# Altium footprint library Connector_PinHeader_2.00mm.PcbLib: 278 footprints (part 5 of 18) (continued)
## PinHeader_1x19_P2.00mm_Horizontal [mm] (continued)
  text "'.Designator'" at 3.006,-21.642 h0.9

## PinHeader_1x19_P2.00mm_Vertical [mm]
pads (19):
  rect 1.35x1.35 hole 0.8: 1(0,0)
  rrect100% 1.35x1.35 hole 0.8: 2(0,-2) 3(0,-4) 4(0,-6) 5(0,-8) 6(0,-10) 7(0,-12) 8(0,-14) 9(0,-16) 10(0,-18) 11(0,-20) 12(0,-22) 13(0,-24) 14(0,-26) 15(0,-28) 16(0,-30) 17(0,-32) 18(0,-34) 19(0,-36)
F.SilkS:
  lines w0.12: -1.06,0 -1.06,1.06 0,1.06 ; -1.06,-37.06 1.06,-37.06 1.06,-1 -1.06,-1 -1.06,-37.06
F.CrtYd:
  lines w0.05: -1.5,-37.5 1.5,-37.5 1.5,1.5 -1.5,1.5 -1.5,-37.5
F.Fab:
  lines w0.1: -1,-37 1,-37 1,1 -0.5,1 -1,0.5 -1,-37
  text "'.Designator'" at 0.84,-22.047 h1

## PinHeader_1x19_P2.00mm_Vertical_SMD_Pin1Left [mm]
pads (19):
  rect 2.35x0.85 smd: 1(-1.175,18) 2(1.175,16) 3(-1.175,14) 4(1.175,12) 5(-1.175,10) 6(1.175,8) 7(-1.175,6) 8(1.175,4) 9(-1.175,2) 10(1.175,0) 11(-1.175,-2) 12(1.175,-4) 13(-1.175,-6) 14(1.175,-8) 15(-1.175,-10) 16(1.175,-12) 17(-1.175,-14) 18(1.175,-16) 19(-1.175,-18)
F.SilkS:
  lines w0.12: -2.29,18.685 -1.06,18.685 -1.06,19.06 1.06,19.06 1.06,16.685 ; -1.06,-19.06 1.06,-19.06 ; -1.06,-17.315 -1.06,-14.685 ; -1.06,-13.315 -1.06,-10.685 ; -1.06,-9.315 -1.06,-6.685 ; -1.06,-5.315 -1.06,-2.685 ; -1.06,-1.315 -1.06,1.315 ; -1.06,2.685 -1.06,5.315 ; -1.06,6.685 -1.06,9.315 ; -1.06,10.685 -1.06,13.315 ; -1.06,14.685 -1.06,17.315 ; 1.06,-18.685 1.06,-19.06 ; 1.06,-16.685 1.06,-19.06 ; 1.06,-15.315 1.06,-12.685 ; 1.06,-11.315 1.06,-8.685 ; 1.06,-7.315 1.06,-4.685 ; 1.06,-3.315 1.06,-0.685 ; 1.06,0.685 1.06,3.315 ; 1.06,4.685 1.06,7.315 ; 1.06,8.685 1.06,11.315 ; 1.06,12.685 1.06,15.315
F.CrtYd:
  lines w0.05: -2.85,-19.5 2.85,-19.5 2.85,19.5 -2.85,19.5 -2.85,-19.5
F.Fab:
  lines w0.1: -1,-18.25 -2.1,-18.25 -2.1,-17.75 -1,-17.75 ; -1,-14.25 -2.1,-14.25 -2.1,-13.75 -1,-13.75 ; -1,-10.25 -2.1,-10.25 -2.1,-9.75 -1,-9.75 ; -1,-6.25 -2.1,-6.25 -2.1,-5.75 -1,-5.75 ; -1,-2.25 -2.1,-2.25 -2.1,-1.75 -1,-1.75 ; -1,1.75 -2.1,1.75 -2.1,2.25 -1,2.25 ; -1,5.75 -2.1,5.75 -2.1,6.25 -1,6.25 ; -1,9.75 -2.1,9.75 -2.1,10.25 -1,10.25 ; -1,13.75 -2.1,13.75 -2.1,14.25 -1,14.25 ; -1,17.75 -2.1,17.75 -2.1,18.25 -1,18.25 ; 1,-16.25 2.1,-16.25 2.1,-15.75 1,-15.75 ; 1,-12.25 2.1,-12.25 2.1,-11.75 1,-11.75 ; 1,-8.25 2.1,-8.25 2.1,-7.75 1,-7.75 ; 1,-4.25 2.1,-4.25 2.1,-3.75 1,-3.75 ; 1,-0.25 2.1,-0.25 2.1,0.25 1,0.25 ; 1,3.75 2.1,3.75 2.1,4.25 1,4.25 ; 1,7.75 2.1,7.75 2.1,8.25 1,8.25 ; 1,11.75 2.1,11.75 2.1,12.25 1,12.25 ; 1,15.75 2.1,15.75 2.1,16.25 1,16.25 ; -1,18.25 -1,-19 1,-19 1,19 -0.25,19 -1,18.25
  text "'.Designator'" at 0.84,-4.047 h1

## PinHeader_1x19_P2.00mm_Vertical_SMD_Pin1Right [mm]
pads (19):
  rect 2.35x0.85 smd: 1(1.175,18) 2(-1.175,16) 3(1.175,14) 4(-1.175,12) 5(1.175,10) 6(-1.175,8) 7(1.175,6) 8(-1.175,4) 9(1.175,2) 10(-1.175,0) 11(1.175,-2) 12(-1.175,-4) 13(1.175,-6) 14(-1.175,-8) 15(1.175,-10) 16(-1.175,-12) 17(1.175,-14) 18(-1.175,-16) 19(1.175,-18)
F.SilkS:
  lines w0.12: -1.06,-18.685 -1.06,-19.06 ; -1.06,-16.685 -1.06,-19.06 ; -1.06,-15.315 -1.06,-12.685 ; -1.06,-11.315 -1.06,-8.685 ; -1.06,-7.315 -1.06,-4.685 ; -1.06,-3.315 -1.06,-0.685 ; -1.06,0.685 -1.06,3.315 ; -1.06,4.685 -1.06,7.315 ; -1.06,8.685 -1.06,11.315 ; -1.06,12.685 -1.06,15.315 ; -1.06,16.685 -1.06,19.06 1.06,19.06 1.06,18.685 2.29,18.685 ; 1.06,-19.06 -1.06,-19.06 ; 1.06,-17.315 1.06,-14.685 ; 1.06,-13.315 1.06,-10.685 ; 1.06,-9.315 1.06,-6.685 ; 1.06,-5.315 1.06,-2.685 ; 1.06,-1.315 1.06,1.315 ; 1.06,2.685 1.06,5.315 ; 1.06,6.685 1.06,9.315 ; 1.06,10.685 1.06,13.315 ; 1.06,14.685 1.06,17.315
F.CrtYd:
  lines w0.05: -2.85,-19.5 2.85,-19.5 2.85,19.5 -2.85,19.5 -2.85,-19.5
F.Fab:
  lines w0.1: -1,-16.25 -2.1,-16.25 -2.1,-15.75 -1,-15.75 ; -1,-12.25 -2.1,-12.25 -2.1,-11.75 -1,-11.75 ; -1,-8.25 -2.1,-8.25 -2.1,-7.75 -1,-7.75 ; -1,-4.25 -2.1,-4.25 -2.1,-3.75 -1,-3.75 ; -1,-0.25 -2.1,-0.25 -2.1,0.25 -1,0.25 ; -1,3.75 -2.1,3.75 -2.1,4.25 -1,4.25 ; -1,7.75 -2.1,7.75 -2.1,8.25 -1,8.25 ; -1,11.75 -2.1,11.75 -2.1,12.25 -1,12.25 ; -1,15.75 -2.1,15.75 -2.1,16.25 -1,16.25 ; 1,-18.25 2.1,-18.25 2.1,-17.75 1,-17.75 ; 1,-14.25 2.1,-14.25 2.1,-13.75 1,-13.75 ; 1,-10.25 2.1,-10.25 2.1,-9.75 1,-9.75 ; 1,-6.25 2.1,-6.25 2.1,-5.75 1,-5.75 ; 1,-2.25 2.1,-2.25 2.1,-1.75 1,-1.75 ; 1,1.75 2.1,1.75 2.1,2.25 1,2.25 ; 1,5.75 2.1,5.75 2.1,6.25 1,6.25 ; 1,9.75 2.1,9.75 2.1,10.25 1,10.25 ; 1,13.75 2.1,13.75 2.1,14.25 1,14.25 ; 1,17.75 2.1,17.75 2.1,18.25 1,18.25 ; 1,18.25 1,-19 -1,-19 -1,19 0.25,19 1,18.25
  text "'.Designator'" at 0.84,-4.047 h1

## PinHeader_1x20_P2.00mm_Horizontal [mm]
pads (20):
  rect 1.35x1.35 hole 0.8: 1(0,0)
  rrect100% 1.35x1.35 hole 0.8: 2(0,-2) 3(0,-4) 4(0,-6) 5(0,-8) 6(0,-10) 7(0,-12) 8(0,-14) 9(0,-16) 10(0,-18) 11(0,-20) 12(0,-22) 13(0,-24) 14(0,-26) 15(0,-28) 16(0,-30) 17(0,-32) 18(0,-34) 19(0,-36) 20(0,-38)
F.SilkS:
  lines w0.12: -1,0 -1,1 0,1 ; 0.882,-38.31 1.44,-38.31 ; 0.882,-37.69 1.44,-37.69 ; 0.882,-36.31 1.44,-36.31 ; 0.882,-35.69 1.44,-35.69 ; 0.882,-34.31 1.44,-34.31 ; 0.882,-33.69 1.44,-33.69 ; 0.882,-32.31 1.44,-32.31 ; 0.882,-31.69 1.44,-31.69 ; 0.882,-30.31 1.44,-30.31 ; 0.882,-29.69 1.44,-29.69 ; 0.882,-28.31 1.44,-28.31 ; 0.882,-27.69 1.44,-27.69 ; 0.882,-26.31 1.44,-26.31 ; 0.882,-25.69 1.44,-25.69 ; 0.882,-24.31 1.44,-24.31 ; 0.882,-23.69 1.44,-23.69 ; 0.882,-22.31 1.44,-22.31 ; 0.882,-21.69 1.44,-21.69 ; 0.882,-20.31 1.44,-20.31 ; 0.882,-19.69 1.44,-19.69 ; 0.882,-18.31 1.44,-18.31 ; 0.882,-17.69 1.44,-17.69 ; 0.882,-16.31 1.44,-16.31 ; 0.882,-15.69 1.44,-15.69 ; 0.882,-14.31 1.44,-14.31 ; 0.882,-13.69 1.44,-13.69 ; 0.882,-12.31 1.44,-12.31 ; 0.882,-11.69 1.44,-11.69 ; 0.882,-10.31 1.44,-10.31 ; 0.882,-9.69 1.44,-9.69 ; 0.882,-8.31 1.44,-8.31 ; 0.882,-7.69 1.44,-7.69 ; 0.882,-6.31 1.44,-6.31 ; 0.882,-5.69 1.44,-5.69 ; 0.882,-4.31 1.44,-4.31 ; 0.882,-3.69 1.44,-3.69 ; 0.882,-2.31 1.44,-2.31 ; 0.882,-1.69 1.44,-1.69 ; 0.935,-0.31 1.44,-0.31 ; 0.935,0.31 1.44,0.31 ; 1.44,-37 3.06,-37 ; 1.44,-35 3.06,-35 ; 1.44,-33 3.06,-33 ; 1.44,-31 3.06,-31 ; 1.44,-29 3.06,-29 ; 1.44,-27 3.06,-27 ; 1.44,-25 3.06,-25 ; 1.44,-23 3.06,-23 ; 1.44,-21 3.06,-21 ; 1.44,-19 3.06,-19 ; 1.44,-17 3.06,-17 ; 1.44,-15 3.06,-15 ; 1.44,-13 3.06,-13 ; 1.44,-11 3.06,-11 ; 1.44,-9 3.06,-9 ; 1.44,-7 3.06,-7 ; 1.44,-5 3.06,-5 ; 1.44,-3 3.06,-3 ; 1.44,-1 3.06,-1 ; 3.06,-38.31 7.26,-38.31 7.26,-37.69 3.06,-37.69 ; 3.06,-36.31 7.26,-36.31 7.26,-35.69 3.06,-35.69 ; 3.06,-34.31 7.26,-34.31 7.26,-33.69 3.06,-33.69 ; 3.06,-32.31 7.26,-32.31 7.26,-31.69 3.06,-31.69 ; 3.06,-30.31 7.26,-30.31 7.26,-29.69 3.06,-29.69 ; 3.06,-28.31 7.26,-28.31 7.26,-27.69 3.06,-27.69 ; 3.06,-26.31 7.26,-26.31 7.26,-25.69 3.06,-25.69 ; 3.06,-24.31 7.26,-24.31 7.26,-23.69 3.06,-23.69 ; 3.06,-22.31 7.26,-22.31 7.26,-21.69 3.06,-21.69 ; 3.06,-20.31 7.26,-20.31 7.26,-19.69 3.06,-19.69 ; 3.06,-18.31 7.26,-18.31 7.26,-17.69 3.06,-17.69 ; 3.06,-16.31 7.26,-16.31 7.26,-15.69 3.06,-15.69 ; 3.06,-14.31 7.26,-14.31 7.26,-13.69 3.06,-13.69 ; 3.06,-12.31 7.26,-12.31 7.26,-11.69 3.06,-11.69 ; 3.06,-10.31 7.26,-10.31 7.26,-9.69 3.06,-9.69 ; 3.06,-8.31 7.26,-8.31 7.26,-7.69 3.06,-7.69 ; 3.06,-6.31 7.26,-6.31 7.26,-5.69 3.06,-5.69 ; 3.06,-4.31 7.26,-4.31 7.26,-3.69 3.06,-3.69 ; 3.06,-2.31 7.26,-2.31 7.26,-1.69 3.06,-1.69 ; 3.06,-0.31 7.26,-0.31 7.26,0.31 3.06,0.31 ; 3.06,-0.23 7.26,-0.23 ; 3.06,-0.11 7.26,-0.11 ; 3.06,0.01 7.26,0.01 ; 3.06,0.13 7.26,0.13 ; 3.06,0.25 7.26,0.25 ; 1.44,-39.06 3.06,-39.06 3.06,1.06 1.44,1.06 1.44,-39.06
F.CrtYd:
  lines w0.05: -1.5,-39.5 -1.5,1.5 7.7,1.5 7.7,-39.5 -1.5,-39.5
F.Fab:
  lines w0.1: 1.5,-38.25 -0.25,-38.25 -0.25,-37.75 1.5,-37.75 ; 1.5,-36.25 -0.25,-36.25 -0.25,-35.75 1.5,-35.75 ; 1.5,-34.25 -0.25,-34.25 -0.25,-33.75 1.5,-33.75 ; 1.5,-32.25 -0.25,-32.25 -0.25,-31.75 1.5,-31.75 ; 1.5,-30.25 -0.25,-30.25 -0.25,-29.75 1.5,-29.75 ; 1.5,-28.25 -0.25,-28.25 -0.25,-27.75 1.5,-27.75 ; 1.5,-26.25 -0.25,-26.25 -0.25,-25.75 1.5,-25.75 ; 1.5,-24.25 -0.25,-24.25 -0.25,-23.75 1.5,-23.75 ; 1.5,-22.25 -0.25,-22.25 -0.25,-21.75 1.5,-21.75 ; 1.5,-20.25 -0.25,-20.25 -0.25,-19.75 1.5,-19.75 ; 1.5,-18.25 -0.25,-18.25 -0.25,-17.75 1.5,-17.75 ; 1.5,-16.25 -0.25,-16.25 -0.25,-15.75 1.5,-15.75 ; 1.5,-14.25 -0.25,-14.25 -0.25,-13.75 1.5,-13.75 ; 1.5,-12.25 -0.25,-12.25 -0.25,-11.75 1.5,-11.75 ; 1.5,-10.25 -0.25,-10.25 -0.25,-9.75 1.5,-9.75 ; 1.5,-8.25 -0.25,-8.25 -0.25,-7.75 1.5,-7.75 ; 1.5,-6.25 -0.25,-6.25 -0.25,-5.75 1.5,-5.75 ; 1.5,-4.25 -0.25,-4.25 -0.25,-3.75 1.5,-3.75 ; 1.5,-2.25 -0.25,-2.25 -0.25,-1.75 1.5,-1.75 ; 1.5,-0.25 -0.25,-0.25 -0.25,0.25 1.5,0.25 ; 3,-38.25 7.2,-38.25 7.2,-37.75 3,-37.75 ; 3,-36.25 7.2,-36.25 7.2,-35.75 3,-35.75 ; 3,-34.25 7.2,-34.25 7.2,-33.75 3,-33.75 ; 3,-32.25 7.2,-32.25 7.2,-31.75 3,-31.75 ; 3,-30.25 7.2,-30.25 7.2,-29.75 3,-29.75 ; 3,-28.25 7.2,-28.25 7.2,-27.75 3,-27.75 ; 3,-26.25 7.2,-26.25 7.2,-25.75 3,-25.75 ; 3,-24.25 7.2,-24.25 7.2,-23.75 3,-23.75 ; 3,-22.25 7.2,-22.25 7.2,-21.75 3,-21.75 ; 3,-20.25 7.2,-20.25 7.2,-19.75 3,-19.75 ; 3,-18.25 7.2,-18.25 7.2,-17.75 3,-17.75 ; 3,-16.25 7.2,-16.25 7.2,-15.75 3,-15.75 ; 3,-14.25 7.2,-14.25 7.2,-13.75 3,-13.75 ; 3,-12.25 7.2,-12.25 7.2,-11.75 3,-11.75 ; 3,-10.25 7.2,-10.25 7.2,-9.75 3,-9.75 ; 3,-8.25 7.2,-8.25 7.2,-7.75 3,-7.75 ; 3,-6.25 7.2,-6.25 7.2,-5.75 3,-5.75 ; 3,-4.25 7.2,-4.25 7.2,-3.75 3,-3.75 ; 3,-2.25 7.2,-2.25 7.2,-1.75 3,-1.75 ; 3,-0.25 7.2,-0.25 7.2,0.25 3,0.25 ; 1.5,-39 3,-39 3,1 1.875,1 1.5,0.625 1.5,-39
  text "'.Designator'" at 3.006,-22.642 h0.9

## PinHeader_1x20_P2.00mm_Vertical [mm]
pads (20):
  rect 1.35x1.35 hole 0.8: 1(0,0)
  rrect100% 1.35x1.35 hole 0.8: 2(0,-2) 3(0,-4) 4(0,-6) 5(0,-8) 6(0,-10) 7(0,-12) 8(0,-14) 9(0,-16) 10(0,-18) 11(0,-20) 12(0,-22) 13(0,-24) 14(0,-26) 15(0,-28) 16(0,-30) 17(0,-32) 18(0,-34) 19(0,-36) 20(0,-38)
F.SilkS:
  lines w0.12: -1.06,0 -1.06,1.06 0,1.06 ; -1.06,-39.06 1.06,-39.06 1.06,-1 -1.06,-1 -1.06,-39.06
F.CrtYd:
  lines w0.05: -1.5,-39.5 -1.5,1.5 1.5,1.5 1.5,-39.5 -1.5,-39.5
F.Fab:
  lines w0.1: -1,-39 1,-39 1,1 -0.5,1 -1,0.5 -1,-39
  text "'.Designator'" at 0.84,-23.047 h1

## PinHeader_1x20_P2.00mm_Vertical_SMD_Pin1Left [mm]
pads (20):
  rect 2.35x0.85 smd: 1(-1.175,19) 2(1.175,17) 3(-1.175,15) 4(1.175,13) 5(-1.175,11) 6(1.175,9) 7(-1.175,7) 8(1.175,5) 9(-1.175,3) 10(1.175,1) 11(-1.175,-1) 12(1.175,-3) 13(-1.175,-5) 14(1.175,-7) 15(-1.175,-9) 16(1.175,-11) 17(-1.175,-13) 18(1.175,-15) 19(-1.175,-17) 20(1.175,-19)
F.SilkS:
  lines w0.12: -2.29,19.685 -1.06,19.685 -1.06,20.06 1.06,20.06 1.06,17.685 ; -1.06,-17.685 -1.06,-20.06 1.06,-20.06 1.06,-19.685 ; -1.06,-16.315 -1.06,-13.685 ; -1.06,-12.315 -1.06,-9.685 ; -1.06,-8.315 -1.06,-5.685 ; -1.06,-4.315 -1.06,-1.685 ; -1.06,-0.315 -1.06,2.315 ; -1.06,3.685 -1.06,6.315 ; -1.06,7.685 -1.06,10.315 ; -1.06,11.685 -1.06,14.315 ; -1.06,15.685 -1.06,18.315 ; 1.06,-18.315 1.06,-15.685 ; 1.06,-14.315 1.06,-11.685 ; 1.06,-10.315 1.06,-7.685 ; 1.06,-6.315 1.06,-3.685 ; 1.06,-2.315 1.06,0.315 ; 1.06,1.685 1.06,4.315 ; 1.06,5.685 1.06,8.315 ; 1.06,9.685 1.06,12.315 ; 1.06,13.685 1.06,16.315
F.CrtYd:
  lines w0.05: -2.85,-20.5 2.85,-20.5 2.85,20.5 -2.85,20.5 -2.85,-20.5
F.Fab:
  lines w0.1: -1,-17.25 -2.1,-17.25 -2.1,-16.75 -1,-16.75 ; -1,-13.25 -2.1,-13.25 -2.1,-12.75 -1,-12.75 ; -1,-9.25 -2.1,-9.25 -2.1,-8.75 -1,-8.75 ; -1,-5.25 -2.1,-5.25 -2.1,-4.75 -1,-4.75 ; -1,-1.25 -2.1,-1.25 -2.1,-0.75 -1,-0.75 ; -1,2.75 -2.1,2.75 -2.1,3.25 -1,3.25 ; -1,6.75 -2.1,6.75 -2.1,7.25 -1,7.25 ; -1,10.75 -2.1,10.75 -2.1,11.25 -1,11.25 ; -1,14.75 -2.1,14.75 -2.1,15.25 -1,15.25 ; -1,18.75 -2.1,18.75 -2.1,19.25 -1,19.25 ; 1,-19.25 2.1,-19.25 2.1,-18.75 1,-18.75 ; 1,-15.25 2.1,-15.25 2.1,-14.75 1,-14.75 ; 1,-11.25 2.1,-11.25 2.1,-10.75 1,-10.75 ; 1,-7.25 2.1,-7.25 2.1,-6.75 1,-6.75 ; 1,-3.25 2.1,-3.25 2.1,-2.75 1,-2.75 ; 1,0.75 2.1,0.75 2.1,1.25 1,1.25 ; 1,4.75 2.1,4.75 2.1,5.25 1,5.25 ; 1,8.75 2.1,8.75 2.1,9.25 1,9.25 ; 1,12.75 2.1,12.75 2.1,13.25 1,13.25 ; 1,16.75 2.1,16.75 2.1,17.25 1,17.25 ; -1,19.25 -1,-20 1,-20 1,20 -0.25,20 -1,19.25
  text "'.Designator'" at 0.84,-4.047 h1

## PinHeader_1x20_P2.00mm_Vertical_SMD_Pin1Right [mm]
pads (20):
  rect 2.35x0.85 smd: 1(1.175,19) 2(-1.175,17) 3(1.175,15) 4(-1.175,13) 5(1.175,11) 6(-1.175,9) 7(1.175,7) 8(-1.175,5) 9(1.175,3) 10(-1.175,1) 11(1.175,-1) 12(-1.175,-3) 13(1.175,-5) 14(-1.175,-7) 15(1.175,-9) 16(-1.175,-11) 17(1.175,-13) 18(-1.175,-15) 19(1.175,-17) 20(-1.175,-19)
F.SilkS:
  lines w0.12: -1.06,-19.685 -1.06,-20.06 1.06,-20.06 1.06,-17.685 ; -1.06,-18.315 -1.06,-15.685 ; -1.06,-14.315 -1.06,-11.685 ; -1.06,-10.315 -1.06,-7.685 ; -1.06,-6.315 -1.06,-3.685 ; -1.06,-2.315 -1.06,0.315 ; -1.06,1.685 -1.06,4.315 ; -1.06,5.685 -1.06,8.315 ; -1.06,9.685 -1.06,12.315 ; -1.06,13.685 -1.06,16.315 ; -1.06,17.685 -1.06,20.06 1.06,20.06 1.06,19.685 2.29,19.685 ; 1.06,-16.315 1.06,-13.685 ; 1.06,-12.315 1.06,-9.685 ; 1.06,-8.315 1.06,-5.685 ; 1.06,-4.315 1.06,-1.685 ; 1.06,-0.315 1.06,2.315 ; 1.06,3.685 1.06,6.315 ; 1.06,7.685 1.06,10.315 ; 1.06,11.685 1.06,14.315 ; 1.06,15.685 1.06,18.315
F.CrtYd:
  lines w0.05: -2.85,-20.5 2.85,-20.5 2.85,20.5 -2.85,20.5 -2.85,-20.5
F.Fab:
  lines w0.1: -1,-19.25 -2.1,-19.25 -2.1,-18.75 -1,-18.75 ; -1,-15.25 -2.1,-15.25 -2.1,-14.75 -1,-14.75 ; -1,-11.25 -2.1,-11.25 -2.1,-10.75 -1,-10.75 ; -1,-7.25 -2.1,-7.25 -2.1,-6.75 -1,-6.75 ; -1,-3.25 -2.1,-3.25 -2.1,-2.75 -1,-2.75 ; -1,0.75 -2.1,0.75 -2.1,1.25 -1,1.25 ; -1,4.75 -2.1,4.75 -2.1,5.25 -1,5.25 ; -1,8.75 -2.1,8.75 -2.1,9.25 -1,9.25 ; -1,12.75 -2.1,12.75 -2.1,13.25 -1,13.25 ; -1,16.75 -2.1,16.75 -2.1,17.25 -1,17.25 ; 1,-17.25 2.1,-17.25 2.1,-16.75 1,-16.75 ; 1,-13.25 2.1,-13.25 2.1,-12.75 1,-12.75 ; 1,-9.25 2.1,-9.25 2.1,-8.75 1,-8.75 ; 1,-5.25 2.1,-5.25 2.1,-4.75 1,-4.75 ; 1,-1.25 2.1,-1.25 2.1,-0.75 1,-0.75 ; 1,2.75 2.1,2.75 2.1,3.25 1,3.25 ; 1,6.75 2.1,6.75 2.1,7.25 1,7.25 ; 1,10.75 2.1,10.75 2.1,11.25 1,11.25 ; 1,14.75 2.1,14.75 2.1,15.25 1,15.25 ; 1,18.75 2.1,18.75 2.1,19.25 1,19.25 ; 1,19.25 0.25,20 -1,20 -1,-20 1,-20 1,19.25
  text "'.Designator'" at 0.84,-4.047 h1

## PinHeader_1x21_P2.00mm_Horizontal [mm]
pads (21):
  rect 1.35x1.35 hole 0.8: 1(0,0)
  rrect100% 1.35x1.35 hole 0.8: 2(0,-2) 3(0,-4) 4(0,-6) 5(0,-8) 6(0,-10) 7(0,-12) 8(0,-14) 9(0,-16) 10(0,-18) 11(0,-20) 12(0,-22) 13(0,-24) 14(0,-26) 15(0,-28) 16(0,-30) 17(0,-32) 18(0,-34) 19(0,-36) 20(0,-38) 21(0,-40)
F.SilkS:
  lines w0.12: -1,0 -1,1 0,1 ; 0.882,-40.31 1.44,-40.31 ; 0.882,-39.69 1.44,-39.69 ; 0.882,-38.31 1.44,-38.31 ; 0.882,-37.69 1.44,-37.69 ; 0.882,-36.31 1.44,-36.31 ; 0.882,-35.69 1.44,-35.69 ; 0.882,-34.31 1.44,-34.31 ; 0.882,-33.69 1.44,-33.69 ; 0.882,-32.31 1.44,-32.31 ; 0.882,-31.69 1.44,-31.69 ; 0.882,-30.31 1.44,-30.31 ; 0.882,-29.69 1.44,-29.69 ; 0.882,-28.31 1.44,-28.31 ; 0.882,-27.69 1.44,-27.69 ; 0.882,-26.31 1.44,-26.31 ; 0.882,-25.69 1.44,-25.69 ; 0.882,-24.31 1.44,-24.31 ; 0.882,-23.69 1.44,-23.69 ; 0.882,-22.31 1.44,-22.31 ; 0.882,-21.69 1.44,-21.69 ; 0.882,-20.31 1.44,-20.31 ; 0.882,-19.69 1.44,-19.69 ; 0.882,-18.31 1.44,-18.31 ; 0.882,-17.69 1.44,-17.69 ; 0.882,-16.31 1.44,-16.31 ; 0.882,-15.69 1.44,-15.69 ; 0.882,-14.31 1.44,-14.31 ; 0.882,-13.69 1.44,-13.69 ; 0.882,-12.31 1.44,-12.31 ; 0.882,-11.69 1.44,-11.69 ; 0.882,-10.31 1.44,-10.31 ; 0.882,-9.69 1.44,-9.69 ; 0.882,-8.31 1.44,-8.31 ; 0.882,-7.69 1.44,-7.69 ; 0.882,-6.31 1.44,-6.31 ; 0.882,-5.69 1.44,-5.69 ; 0.882,-4.31 1.44,-4.31 ; 0.882,-3.69 1.44,-3.69 ; 0.882,-2.31 1.44,-2.31 ; 0.882,-1.69 1.44,-1.69 ; 0.935,-0.31 1.44,-0.31 ; 0.935,0.31 1.44,0.31 ; 1.44,-39 3.06,-39 ; 1.44,-37 3.06,-37 ; 1.44,-35 3.06,-35 ; 1.44,-33 3.06,-33 ; 1.44,-31 3.06,-31 ; 1.44,-29 3.06,-29 ; 1.44,-27 3.06,-27 ; 1.44,-25 3.06,-25 ; 1.44,-23 3.06,-23 ; 1.44,-21 3.06,-21 ; 1.44,-19 3.06,-19 ; 1.44,-17 3.06,-17 ; 1.44,-15 3.06,-15 ; 1.44,-13 3.06,-13 ; 1.44,-11 3.06,-11 ; 1.44,-9 3.06,-9 ; 1.44,-7 3.06,-7 ; 1.44,-5 3.06,-5 ; 1.44,-3 3.06,-3 ; 1.44,-1 3.06,-1 ; 3.06,-40.31 7.26,-40.31 7.26,-39.69 3.06,-39.69 ; 3.06,-38.31 7.26,-38.31 7.26,-37.69 3.06,-37.69 ; 3.06,-36.31 7.26,-36.31 7.26,-35.69 3.06,-35.69 ; 3.06,-34.31 7.26,-34.31 7.26,-33.69 3.06,-33.69 ; 3.06,-32.31 7.26,-32.31 7.26,-31.69 3.06,-31.69 ; 3.06,-30.31 7.26,-30.31 7.26,-29.69 3.06,-29.69 ; 3.06,-28.31 7.26,-28.31 7.26,-27.69 3.06,-27.69 ; 3.06,-26.31 7.26,-26.31 7.26,-25.69 3.06,-25.69 ; 3.06,-24.31 7.26,-24.31 7.26,-23.69 3.06,-23.69 ; 3.06,-22.31 7.26,-22.31 7.26,-21.69 3.06,-21.69 ; 3.06,-20.31 7.26,-20.31 7.26,-19.69 3.06,-19.69 ; 3.06,-18.31 7.26,-18.31 7.26,-17.69 3.06,-17.69 ; 3.06,-16.31 7.26,-16.31 7.26,-15.69 3.06,-15.69 ; 3.06,-14.31 7.26,-14.31 7.26,-13.69 3.06,-13.69 ; 3.06,-12.31 7.26,-12.31 7.26,-11.69 3.06,-11.69 ; 3.06,-10.31 7.26,-10.31 7.26,-9.69 3.06,-9.69 ; 3.06,-8.31 7.26,-8.31 7.26,-7.69 3.06,-7.69 ; 3.06,-6.31 7.26,-6.31 7.26,-5.69 3.06,-5.69 ; 3.06,-4.31 7.26,-4.31 7.26,-3.69 3.06,-3.69 ; 3.06,-2.31 7.26,-2.31 7.26,-1.69 3.06,-1.69 ; 3.06,-0.31 7.26,-0.31 7.26,0.31 3.06,0.31 ; 3.06,-0.23 7.26,-0.23 ; 3.06,-0.11 7.26,-0.11 ; 3.06,0.01 7.26,0.01 ; 3.06,0.13 7.26,0.13 ; 3.06,0.25 7.26,0.25 ; 1.44,-41.06 1.44,1.06 3.06,1.06 3.06,-41.06 1.44,-41.06
F.CrtYd:
  lines w0.05: -1.5,-41.5 -1.5,1.5 7.7,1.5 7.7,-41.5 -1.5,-41.5
F.Fab:
  lines w0.1: 1.5,-40.25 -0.25,-40.25 -0.25,-39.75 1.5,-39.75 ; 1.5,-38.25 -0.25,-38.25 -0.25,-37.75 1.5,-37.75 ; 1.5,-36.25 -0.25,-36.25 -0.25,-35.75 1.5,-35.75 ; 1.5,-34.25 -0.25,-34.25 -0.25,-33.75 1.5,-33.75 ; 1.5,-32.25 -0.25,-32.25 -0.25,-31.75 1.5,-31.75 ; 1.5,-30.25 -0.25,-30.25 -0.25,-29.75 1.5,-29.75 ; 1.5,-28.25 -0.25,-28.25 -0.25,-27.75 1.5,-27.75 ; 1.5,-26.25 -0.25,-26.25 -0.25,-25.75 1.5,-25.75 ; 1.5,-24.25 -0.25,-24.25 -0.25,-23.75 1.5,-23.75 ; 1.5,-22.25 -0.25,-22.25 -0.25,-21.75 1.5,-21.75 ; 1.5,-20.25 -0.25,-20.25 -0.25,-19.75 1.5,-19.75 ; 1.5,-18.25 -0.25,-18.25 -0.25,-17.75 1.5,-17.75 ; 1.5,-16.25 -0.25,-16.25 -0.25,-15.75 1.5,-15.75 ; 1.5,-14.25 -0.25,-14.25 -0.25,-13.75 1.5,-13.75 ; 1.5,-12.25 -0.25,-12.25 -0.25,-11.75 1.5,-11.75 ; 1.5,-10.25 -0.25,-10.25 -0.25,-9.75 1.5,-9.75 ; 1.5,-8.25 -0.25,-8.25 -0.25,-7.75 1.5,-7.75 ; 1.5,-6.25 -0.25,-6.25 -0.25,-5.75 1.5,-5.75 ; 1.5,-4.25 -0.25,-4.25 -0.25,-3.75 1.5,-3.75 ; 1.5,-2.25 -0.25,-2.25 -0.25,-1.75 1.5,-1.75 ; 1.5,-0.25 -0.25,-0.25 -0.25,0.25 1.5,0.25 ; 3,-40.25 7.2,-40.25 7.2,-39.75 3,-39.75 ; 3,-38.25 7.2,-38.25 7.2,-37.75 3,-37.75 ; 3,-36.25 7.2,-36.25 7.2,-35.75 3,-35.75 ; 3,-34.25 7.2,-34.25 7.2,-33.75 3,-33.75 ; 3,-32.25 7.2,-32.25 7.2,-31.75 3,-31.75 ; 3,-30.25 7.2,-30.25 7.2,-29.75 3,-29.75 ; 3,-28.25 7.2,-28.25 7.2,-27.75 3,-27.75 ; 3,-26.25 7.2,-26.25 7.2,-25.75 3,-25.75 ; 3,-24.25 7.2,-24.25 7.2,-23.75 3,-23.75 ; 3,-22.25 7.2,-22.25 7.2,-21.75 3,-21.75 ; 3,-20.25 7.2,-20.25 7.2,-19.75 3,-19.75 ; 3,-18.25 7.2,-18.25 7.2,-17.75 3,-17.75 ; 3,-16.25 7.2,-16.25 7.2,-15.75 3,-15.75 ; 3,-14.25 7.2,-14.25 7.2,-13.75 3,-13.75 ; 3,-12.25 7.2,-12.25 7.2,-11.75 3,-11.75 ; 3,-10.25 7.2,-10.25 7.2,-9.75 3,-9.75 ; 3,-8.25 7.2,-8.25 7.2,-7.75 3,-7.75 ; 3,-6.25 7.2,-6.25 7.2,-5.75 3,-5.75 ; 3,-4.25 7.2,-4.25 7.2,-3.75 3,-3.75 ; 3,-2.25 7.2,-2.25 7.2,-1.75 3,-1.75 ; 3,-0.25 7.2,-0.25 7.2,0.25 3,0.25 ; 1.5,-41 1.5,0.625 1.875,1 3,1 3,-41 1.5,-41
  text "'.Designator'" at 3.006,-23.642 h0.9

## PinHeader_1x21_P2.00mm_Vertical [mm]
pads (21):
  rect 1.35x1.35 hole 0.8: 1(0,0)
  rrect100% 1.35x1.35 hole 0.8: 2(0,-2) 3(0,-4) 4(0,-6) 5(0,-8) 6(0,-10) 7(0,-12) 8(0,-14) 9(0,-16) 10(0,-18) 11(0,-20) 12(0,-22) 13(0,-24) 14(0,-26) 15(0,-28) 16(0,-30) 17(0,-32) 18(0,-34) 19(0,-36) 20(0,-38) 21(0,-40)
F.SilkS:
  lines w0.12: -1.06,0 -1.06,1.06 0,1.06 ; -1.06,-41.06 -1.06,-1 1.06,-1 1.06,-41.06 -1.06,-41.06
F.CrtYd:
  lines w0.05: -1.5,-41.5 1.5,-41.5 1.5,1.5 -1.5,1.5 -1.5,-41.5
F.Fab:
  lines w0.1: -1,-41 1,-41 1,1 -0.5,1 -1,0.5 -1,-41
  text "'.Designator'" at 0.84,-24.047 h1